# Altium footprint library LUCHADOR PCBLIB.PcbLib: 75 footprints (part 4 of 5)
Each footprint in its own frame and in the unit in brackets; x right, y up, seen from the top. Pads: shape width x height; smd on the part's side, far side on the other; paste and mask are expansions set on the pad; w line width, h text height; cw(c..) or ccw(c..) is an arc to the next point about the centre after c.
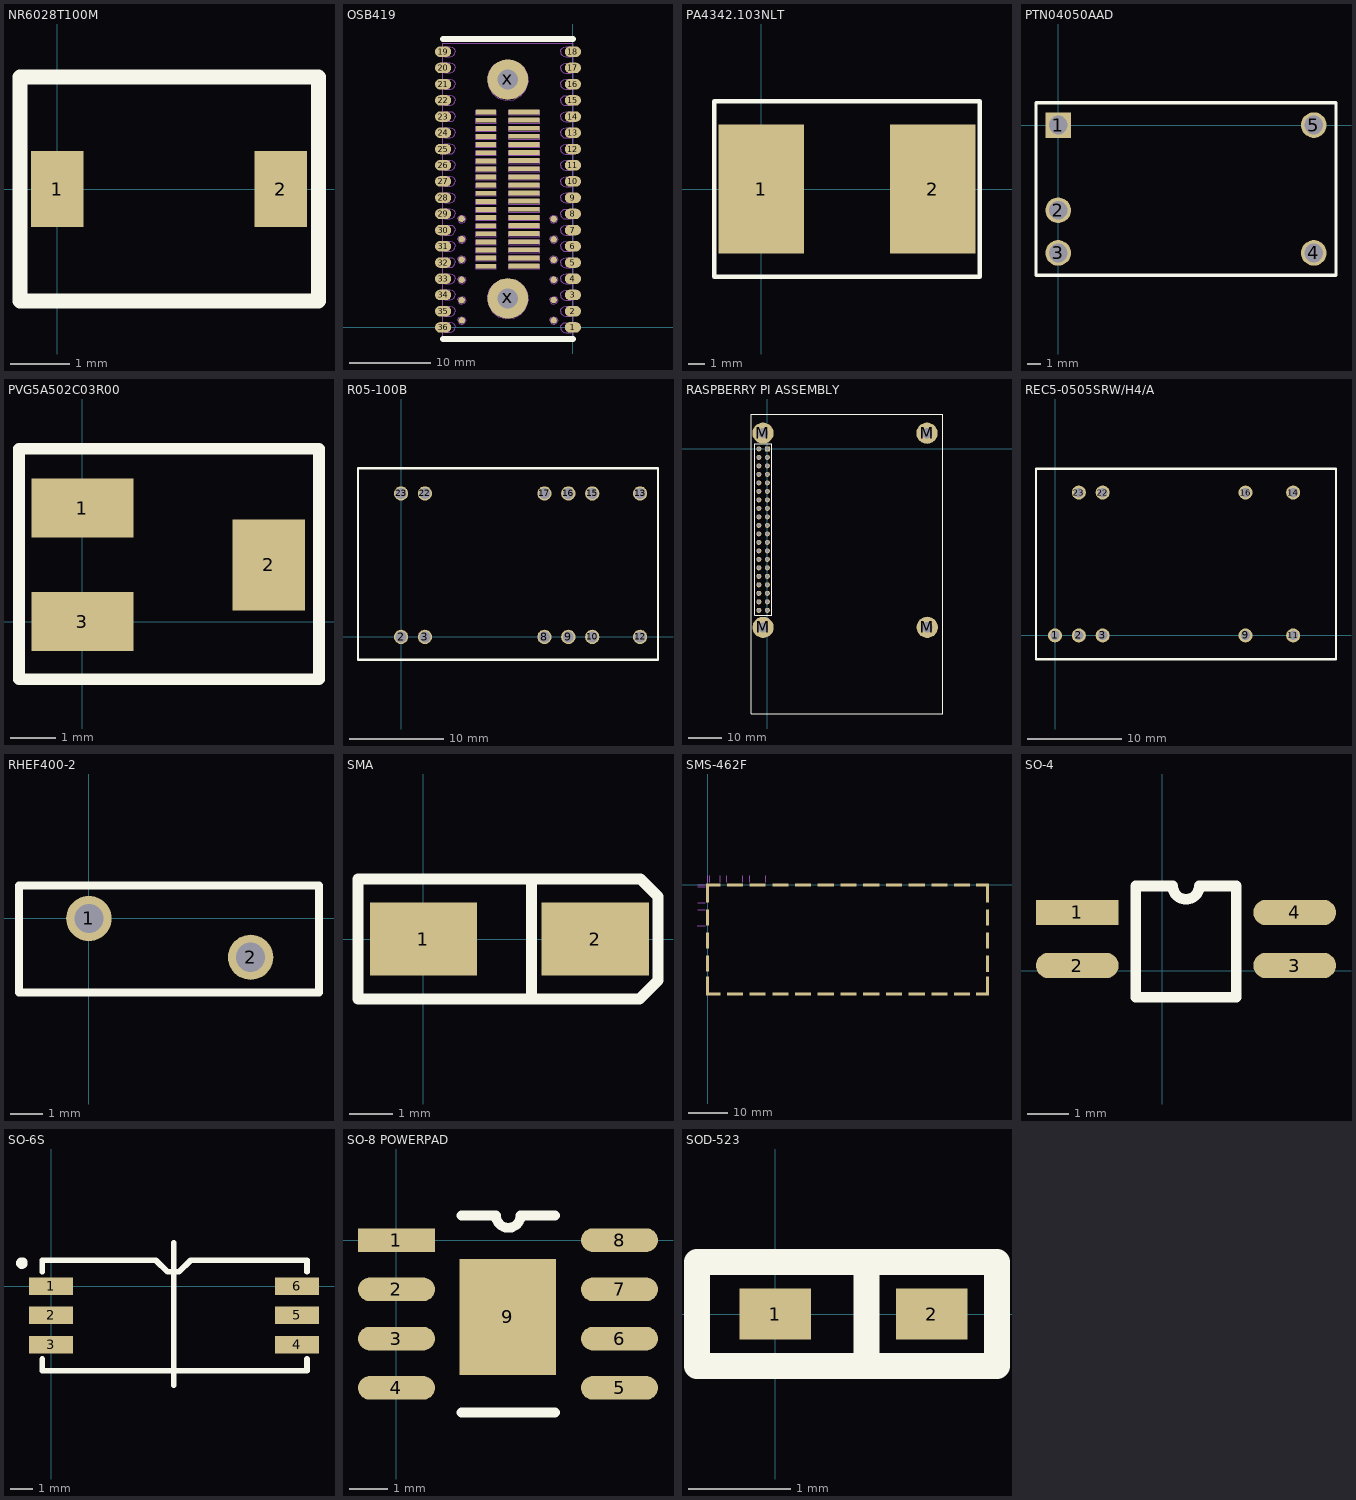
[diagram p3: the footprints below, top view; thin cyan lines are the x and y axes]

## NR6028T100M [mm]
pads (2):
  rect 0.9x1.3 smd: 1(0,0) 2(3.8,0)
Top Overlay:
  lines w0.254: -0.635,-1.905 4.445,-1.905 4.445,1.905 -0.635,1.905 -0.635,-1.905
3D body "vlf4104.STEP": height 1.51, standoff 0.01, extent -0.071,-1.8 3.882,1.8

## OSB419 [mm]
pads (90):
  oval 2x1.3 smd: 1(0,0) 2(0,2) 3(0,4) 4(0,6) 5(0,8) 6(0,10) 7(0,12) 8(0,14) 9(0,16) 10(0,18) 11(0,20) 12(0,22) 13(0,24) 14(0,26) 15(0,28) 16(0,30) 17(0,32) 18(0,34) 19(-16,34) 20(-16,32) 21(-16,30) 22(-16,28) 23(-16,26) 24(-16,24) 25(-16,22) 26(-16,20) 27(-16,18) 28(-16,16) 29(-16,14) 30(-16,12) 31(-16,10) 32(-16,8) 33(-16,6) 34(-16,4) 35(-16,2) 36(-16,0)
  round 0.8 smd: x(-13.716,3.353) x(-13.716,5.867) x(-13.716,8.357) x(-13.716,10.871) x(-13.716,13.386) x(-13.691,0.864) x(-2.362,0.864) x(-2.362,3.378) x(-2.362,5.867) x(-2.362,8.331) x(-2.362,10.846) x(-2.362,13.36)
  rect 2.5x0.6 smd: x(-10.719,7.544) x(-10.719,8.544) x(-10.719,9.544) x(-10.719,10.544) x(-10.719,11.544) x(-10.719,12.544) x(-10.719,13.544) x(-10.719,14.544) x(-10.719,15.544) x(-10.719,16.544) x(-10.719,17.544) x(-10.719,18.544) x(-10.719,19.544) x(-10.719,20.544) x(-10.719,21.544) x(-10.719,22.544) x(-10.719,23.544) x(-10.719,24.544) x(-10.719,25.544) x(-10.719,26.544)
  round 5 hole 2.5: x(-8.02,3.569) x(-8.02,30.569)
  rect 3.8x0.6 smd: x(-6.02,7.569) x(-6.02,8.569) x(-6.02,9.569) x(-6.02,10.569) x(-6.02,11.569) x(-6.02,12.569) x(-6.02,13.569) x(-6.02,14.569) x(-6.02,15.569) x(-6.02,16.569) x(-6.02,17.569) x(-6.02,18.569) x(-6.02,19.569) x(-6.02,20.569) x(-6.02,21.569) x(-6.02,22.569) x(-6.02,23.569) x(-6.02,24.569) x(-6.02,25.569) x(-6.02,26.569)
Top Overlay:
  lines w0.762: -16.02,-1.431 -0.02,-1.431 ; -16.02,35.569 -0.02,35.569
Mechanical 10:
  drawing of 816 lines, arcs and shapes, not listed

## PA4342.103NLT [mil]
pads (2):
  rect 200x300 smd: 1(0,0) 2(400,0)
Top Overlay:
  lines w10: -110,-205 -110,205 510,205 510,-205 -110,-205
3D body "PA4342.103NLT.STEP": height 162.96, standoff 0.48, extent -38.38,-203.76 424.38,201.76

## PTN04050AAD [mil]
pads (5):
  rect 75x75 hole 55: 1(0,0)
  round 75 hole 55: 2(0,-250) 3(0,-375) 4(750,-375) 5(750,0)
Top Overlay:
  lines w10: -65,-440 815,-440 815,65 -40,65 -65,65 -65,-440
3D body "PTN04050AAD.STEP": height 263.48, standoff -86.52, extent -61,-434.5 809,60.5

## PVG5A502C03R00 [mm]
pads (3):
  rect 2.25x1.3 smd: 1(0,2.5) 3(0,0)
  rect 1.6x2 smd: 2(4.1,1.25)
Top Overlay:
  lines w0.254: -1.397,-1.27 -1.397,3.81 5.207,3.81 5.207,-1.27 0.635,-1.27 -1.397,-1.27
3D body "PVG5A502C03R00.STEP": height 5.24, standoff 0.01, extent 0.155,-1.13 3.909,3.67

## R05-100B [mil]
pads (12):
  round 60 hole 45: 2(0,0) 3(100,0) 8(600,0) 9(700,0) 10(800,0) 12(1000,0) 13(1000,600) 15(800,600) 16(700,600) 17(600,600) 22(100,600) 23(0,600)
Top Overlay:
  lines w10: -180,-95 -180,705 1075,705 1075,-95 -180,-95
3D body "R05-100B.STEP": height 370.56, standoff -160.93, extent -179.98,-95.6 1071.99,703.61

## RASPBERRY PI [mil]
3D body "Raspberry Pi 3.STEP": height 649.21, standoff -82.68, extent -51841.32,-50939.06 -48312.32,-48682.73

## RASPBERRY PI ASSEMBLY [mil]
pads (44):
  rect 60x60 hole 40: 1(0,0)
  round 60 hole 40: 2(-100,0) 3(0,-100) 4(-100,-100) 5(0,-200) 6(-100,-200) 7(0,-300) 8(-100,-300) 9(0,-400) 10(-100,-400) 11(0,-500) 12(-100,-500) 13(0,-600) 14(-100,-600) 15(0,-700) 16(-100,-700) 17(0,-800) 18(-100,-800) 19(0,-900) 20(-100,-900) 21(0,-1000) 22(-100,-1000) 23(0,-1100) 24(-100,-1100) 25(0,-1200) 26(-100,-1200) 27(0,-1300) 28(-100,-1300) 29(0,-1400) 30(-100,-1400) 31(0,-1500) 32(-100,-1500) 33(0,-1600) 34(-100,-1600) 35(0,-1700) 36(-100,-1700) 37(0,-1800) 38(-100,-1800) 39(0,-1900) 40(-100,-1900)
  round 250 hole 120: M(-51,185) M(-50,-2101) M(1879,184) M(1882,-2100)
Top Overlay:
  lines w8: -150,-1960 50,-1960 50,60 -150,60 -150,-1960
  lines w10: -190,-3120 -190,410 2065,410 2065,-3120 -190,-3120
3D body "91780A111_ALUM FEM THRDED HEX STANDOFF.STEP": height 625.48, standoff 0.48, extent -144.74,75.76 42.76,292.26
3D body "91780A111_ALUM FEM THRDED HEX STANDOFF.STEP": height 625.48, standoff 0.48, extent 1783.26,76.76 1970.76,293.26
3D body "91780A111_ALUM FEM THRDED HEX STANDOFF.STEP": height 625.48, standoff 0.48, extent 1786.25,-2208.51 1973.75,-1992
3D body "90272A077_ZINC-PLTD STL PAN HEAD PHILLIPS MACHINE SCREW.STEP": height -430, standoff -739.29, extent -135.49,-2184.49 31.51,-2017.49
3D body "90272A077_ZINC-PLTD STL PAN HEAD PHILLIPS MACHINE SCREW.STEP": height -430, standoff -739.29, extent 1796.51,-2184.49 1963.51,-2017.49
3D body "90272A077_ZINC-PLTD STL PAN HEAD PHILLIPS MACHINE SCREW.STEP": height -430, standoff -739.29, extent 1792.51,104.51 1959.51,271.51
3D body "90272A077_ZINC-PLTD STL PAN HEAD PHILLIPS MACHINE SCREW.STEP": height -430, standoff -739.29, extent -135.5,102.5 31.5,269.5
3D body "91780A111_ALUM FEM THRDED HEX STANDOFF.STEP": height 625.48, standoff 0.48, extent -146.75,-2208.25 40.76,-1991.74
3D body "ESQ-120-12-G-D.stp": height 435.48, standoff -89.52, extent -150,-1960 50,60
3D body "Raspberry Pi 3.STEP": height 728.43, standoff -3.46, extent -190,-3120 2066.33,409
3D body "90272A077_ZINC-PLTD STL PAN HEAD PHILLIPS MACHINE SCREW.STEP": height 79.29, standoff -230, extent 1798.51,-2183.49 1965.51,-2016.49
3D body "90272A077_ZINC-PLTD STL PAN HEAD PHILLIPS MACHINE SCREW.STEP": height 79.29, standoff -230, extent 1795.51,100.51 1962.51,267.51
3D body "90272A077_ZINC-PLTD STL PAN HEAD PHILLIPS MACHINE SCREW.STEP": height 79.29, standoff -230, extent -134.49,101.51 32.51,268.51
3D body "90272A077_ZINC-PLTD STL PAN HEAD PHILLIPS MACHINE SCREW.STEP": height 79.29, standoff -230, extent -133.49,-2184.49 33.51,-2017.49

## REC5-0505SRW/H4/A [mm]
pads (9):
  round 1.5 hole 1: 1(0,0) 2(2.54,0) 3(5.08,0) 9(20.32,0) 11(25.4,0) 14(25.4,15.24) 16(20.32,15.24) 22(5.08,15.24) 23(2.54,15.24)
Top Overlay:
  lines w0.254: -2.032,-2.54 29.972,-2.54 29.972,17.78 -2.032,17.78 -2.032,-2.54
3D body "Recom.STEP": height 10.21, standoff -3.79, extent -2.055,-2.555 29.945,17.745

## RHEF400-2 [mm]
pads (2):
  round 1.4 hole 0.9: 1(0,0) 2(5,-1.2)
Top Overlay:
  lines w0.254: -2.159,-2.286 -2.159,1.016 7.112,1.016 7.112,-2.286 -2.159,-2.286
3D body "RHEF400-2.STEP": height 16, standoff -2.29, extent -2.067,-2.111 7.147,0.889

## SMA [mm]
pads (2):
  rect 2.5x1.7 smd: 1(0,0) 2(4,0)
Top Overlay:
  lines w0.254: 2.515,-1.397 2.515,1.397 ; -1.524,-1.397 -1.524,1.397 5.055,1.397 5.461,0.991 5.461,-0.965 5.029,-1.397 -1.524,-1.397
3D body "User Library-DO-214AC(SMA).STEP": height 2.3, standoff 0.01, extent -0.711,-1.397 4.775,1.397

## SMS-462F [mil]
pads (36):
  rect 30x190 smd: M(0,-1002) M(0,-80) M(2770,-1002) M(2770,-80)
  rect 30x159 smd: M(0,-780) M(0,-552) M(0,-323) M(2770,-781) M(2770,-552) M(2770,-323)
  rect 125x30 smd: M(65,-1082) M(65,0) M(2722,-1082) M(2722,0)
  rect 160x30 smd: M(270,-1082) M(270,0) M(495,-1082) M(495,0) M(720,-1082) M(720,0) M(945,-1082) M(945,0) M(1170,-1082) M(1170,0) M(1395,-1082) M(1395,0) M(1620,-1082) M(1620,0) M(1845,-1082) M(1845,0) M(2070,-1082) M(2070,0) M(2295,-1082) M(2295,0) M(2520,-1082) M(2520,0)
Dims:
  lines w1: -105,-403 -25,-403 ; -100,-244 -25,-244 ; -100,-175 -25,-175 ; -100,-20 -25,-20 ; -100,0 -25,0 ; 0,25 0,90 ; 20,25 20,90 ; 125,25 125,90 ; 190,25 190,90 ; 350,25 350,90 ; 415,25 415,90 ; 575,25 575,90
3D body "rf frame assembly.STEP": height 251.5, standoff 0.5, extent -7,-1087 2775,7

## SO-4 [mil]
pads (4):
  rect 78x24 smd: 1(-80,55)
  oval 78x24 smd: 2(-80,5) 3(125,5) 4(125,55)
Top Overlay:
  lines w10: -25,-25 70,-25 70,80 35,80 cw(c22.5,80) 10,80 -25,80 -25,-25
3D body "SO-4.STEP": height 83.16, standoff -6.08, extent -113.14,-21.18 162.8,81.18

## SO-6S [mm] "WIDE SO-6 FOR OPTOS"
pads (6):
  rect 1.91x0.76 smd: 1(0,0) 2(0,-1.27) 3(0,-2.54) 4(10.74,-2.54) 5(10.74,-1.27) 6(10.74,0)
Top Overlay:
  circle w0.254: c-1.27,1.016 r0.127
  lines w0.254: -0.381,-3.175 -0.381,-3.683 11.176,-3.683 11.176,-3.175 ; -0.381,0.635 -0.381,1.143 4.572,1.143 5.08,0.635 5.588,0.635 6.096,1.143 11.176,1.143 11.176,0.635 ; 5.359,-4.318 5.359,1.905
3D body "OPTO.STEP": height 3.4, standoff 0.01, extent -0.365,-3.643 11.135,1.103

## SO-8 POWERPAD [mil]
pads (9):
  rect 78x24 smd: 1(0,0)
  oval 78x24 smd: 2(0,-50) 3(0,-100) 4(0,-150) 5(226.38,-150) 6(226.38,-100) 7(226.38,-50) 8(226.38,0)
  rect 98.03x118.11 smd: 9(113,-78)
Top Overlay:
  lines w10: 66,-175 161,-175 ; 66,25 101,25 ccw(c113.5,25) 126,25 161,25
3D body "User Library-SOIC-8.STEP": height 68.9, standoff 0.01, extent -5.67,-173.85 231,23

## SOD-523 [mm]
pads (2):
  rect 0.7x0.5 smd: 1(0,0) 2(1.524,0)
Top Overlay:
  lines w0.254: 0.889,-0.508 0.889,0.508 1.016,0.508 ; -0.762,-0.508 2.159,-0.508 2.159,0.508 -0.381,0.508 -0.762,0.508 -0.762,-0.508
3D body "User Library-SOD523-2.STEP": height 0.66, standoff 0.01, extent -0.063,-0.4 1.587,0.4